# Altium footprint library PcbLib.PcbLib: 142 footprints (part 9 of 9)
Each footprint in its own frame and in the unit in brackets; x right, y up, seen from the top. Pads: shape width x height; smd on the part's side, far side on the other; paste and mask are expansions set on the pad; w line width, h text height; cw(c..) or ccw(c..) is an arc to the next point about the centre after c.
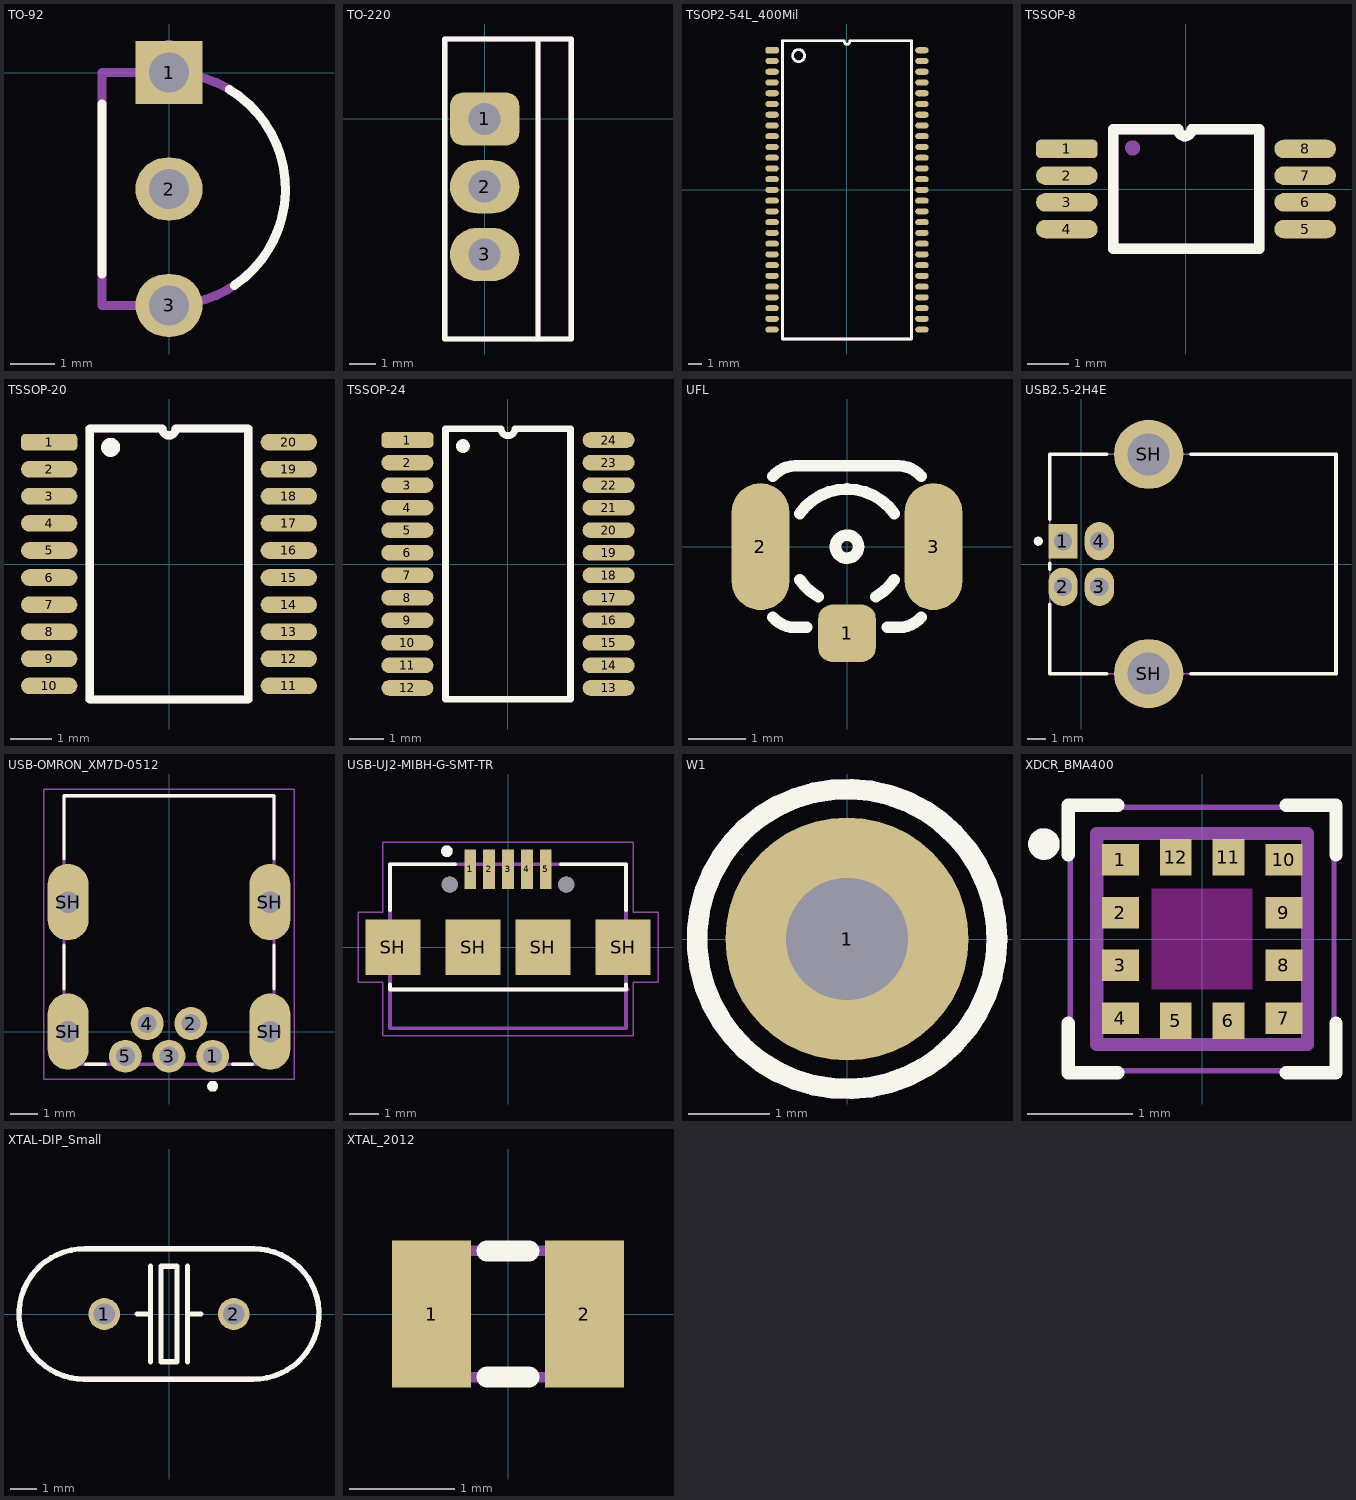
[diagram p8: the footprints below, top view; thin cyan lines are the x and y axes]

## TO-92 [mm]
pads (3):
  rect 1.5x1.4 hole 0.9: 1(0,0)
  oval 1.5x1.4 hole 0.9: 2(0,-2.6) 3(0,-5.2)
Top Overlay:
  lines w0.2: -1.5,-4.5 -1.5,-0.7 ; 1.352,-0.379 cw(c0,-2.6) 1.46,-4.751
Mechanical 29:
  circle w0.254: c0,0.5 r0.1
  lines w0.2: -1.5,-5.2 0,-5.2 ccw(c0,-2.6) 0,0 -1.5,0 -1.5,-5.2
  text ".Designator" at -0.9,-3.067 h1
3D body "TO-92_Cut.STEP": height 10.67, standoff -1.12, extent -1.5,-5.45 2.625,0.3

## TO-220 [mm]
pads (3):
  rrect50% 2.6x2 hole 1.2: 1(0,0)
  oval 2.6x2 hole 1.2: 2(0,-2.54) 3(0,-5.08)
Top Overlay:
  lines w0.2: 2,-8.25 2,3 ; -1.5,-8.25 3.25,-8.25 3.25,3 -1.5,3 -1.5,-8.25
Mechanical 29:
  lines w0.2: 2,-8.25 2,3 ; -1.5,-8.25 -1.5,3 3.25,3 3.25,-8.25 -1.5,-8.25
  text ".Designator" at 0.283,-1.7 h1
3D body "User Library-TO220AB.step": height 20.33, standoff -9, extent -1.495,-8.147 3.195,3.067

## TSOP2-54L_400Mil [mm]
pads (54):
  rrect50% 1x0.45 smd mask+0.05: 1(-5.58,10.4)
  oval 1x0.45 smd mask+0.05: 2(-5.58,9.6) 3(-5.58,8.8) 4(-5.58,8) 5(-5.58,7.2) 6(-5.58,6.4) 7(-5.58,5.6) 8(-5.58,4.8) 9(-5.58,4) 10(-5.58,3.2) 11(-5.58,2.4) 12(-5.58,1.6) 13(-5.58,0.8) 14(-5.58,0) 15(-5.58,-0.8) 16(-5.58,-1.6) 17(-5.58,-2.4) 18(-5.58,-3.2) 19(-5.58,-4) 20(-5.58,-4.8) 21(-5.58,-5.6) 22(-5.58,-6.4) 23(-5.58,-7.2) 24(-5.58,-8) 25(-5.58,-8.8) 26(-5.58,-9.6) 27(-5.58,-10.4) 28(5.58,-10.4) 29(5.58,-9.6) 30(5.58,-8.8) 31(5.58,-8) 32(5.58,-7.2) 33(5.58,-6.4) 34(5.58,-5.6) 35(5.58,-4.8) 36(5.58,-4) 37(5.58,-3.2) 38(5.58,-2.4) 39(5.58,-1.6) 40(5.58,-0.8) 41(5.58,0) 42(5.58,0.8) 43(5.58,1.6) 44(5.58,2.4) 45(5.58,3.2) 46(5.58,4) 47(5.58,4.8) 48(5.58,5.6) 49(5.58,6.4) 50(5.58,7.2) 51(5.58,8) 52(5.58,8.8) 53(5.58,9.6) 54(5.58,10.4)
Top Overlay:
  circle w0.2: c-3.6,10 r0.447
  lines w0.2: -0.203,11.039 ccw(c-0.003,11.039) 0.197,11.039 ; -0.2,11.1 -4.8,11.1 -4.8,-11.1 4.8,-11.1 4.8,11.1 0.2,11.1
Mechanical 29:
  circle w0.2: c-3.6,10 r0.447
  lines w0.2: -0.203,11.039 ccw(c-0.003,11.039) 0.197,11.039 ; -0.2,11.1 -4.8,11.1 -4.8,-11.1 4.8,-11.1 4.8,11.1 0.2,11.1
  text ".Designator" at 0.834,-1.7 h2
3D body "User Library-TSOP2-54.STEP": height 1.3, standoff -0.4, extent -5.879,-11.134 5.881,11.086

## TSSOP-8 [mm]
pads (8):
  rrect50% 1.5x0.45 smd mask+0.05: 1(-2.9,0.975)
  oval 1.5x0.45 smd mask+0.05: 2(-2.9,0.325) 3(-2.9,-0.325) 4(-2.9,-0.975) 5(2.9,-0.975) 6(2.9,-0.325) 7(2.9,0.325) 8(2.9,0.975)
Top Overlay:
  lines w0.254: 1.78,-1.45 1.315,-1.45 -1.775,-1.45 -1.775,1.45 -1.465,1.45 -1.34,1.45 -0.187,1.45 ccw(c-0.025,1.45) 0.138,1.45 1.29,1.45 1.78,1.45 ; 1.785,-1.446 1.785,1.454
Mechanical 29:
  circle w0.254: c-1.3,1 r0.056
  lines w0.254: 1.78,-1.45 1.315,-1.45 -1.775,-1.45 -1.775,1.45 -1.465,1.45 -1.34,1.45 -0.187,1.45 ccw(c-0.025,1.45) 0.138,1.45 1.29,1.45 1.78,1.45 ; 1.785,-1.446 1.785,1.454
  text ".Designator" at -0.846,-0.488 h1
3D body "PW8.step": height 1.2, standoff 0, extent -3.327,-1.549 3.277,1.549

## TSSOP-20 [mm]
pads (20):
  rrect50% 1.35x0.4 smd mask+0.08: 1(-2.875,2.925)
  oval 1.35x0.4 smd mask+0.08: 2(-2.875,2.275) 3(-2.875,1.625) 4(-2.875,0.975) 5(-2.875,0.325) 6(-2.875,-0.325) 7(-2.875,-0.975) 8(-2.875,-1.625) 9(-2.875,-2.275) 10(-2.875,-2.925) 11(2.875,-2.925) 12(2.875,-2.275) 13(2.875,-1.625) 14(2.875,-0.975) 15(2.875,-0.325) 16(2.875,0.325) 17(2.875,0.975) 18(2.875,1.625) 19(2.875,2.275) 20(2.875,2.925)
Top Overlay:
  circle w0.254: c-1.4,2.8 r0.1
  lines w0.2: -1.9,-3.25 1.9,-3.25 1.9,3.25 0.162,3.25 cw(c0,3.25) -0.162,3.25 -1.9,3.25 -1.9,-3.25
Mechanical 29:
  circle w0.254: c-1.4,2.8 r0.1
  lines w0.2: -1.9,-3.25 1.9,-3.25 1.9,3.25 0.162,3.25 cw(c0,3.25) -0.162,3.25 -1.9,3.25 -1.9,-3.25
  text ".Designator" at 0.567,-1.7 h1
3D body "User Library-TSSOP-20-2.STEP": height 1.2, standoff 0, extent -3.2,-3.25 3.2,3.25

## TSSOP-24 [mm]
pads (24):
  rrect50% 1.5x0.45 smd mask+0.08: 1(-2.9,3.575)
  oval 1.5x0.45 smd mask+0.08: 2(-2.9,2.925) 3(-2.9,2.275) 4(-2.9,1.625) 5(-2.9,0.975) 6(-2.9,0.325) 7(-2.9,-0.325) 8(-2.9,-0.975) 9(-2.9,-1.625) 10(-2.9,-2.275) 11(-2.9,-2.925) 12(-2.9,-3.575) 13(2.9,-3.575) 14(2.9,-2.925) 15(2.9,-2.275) 16(2.9,-1.625) 17(2.9,-0.975) 18(2.9,-0.325) 19(2.9,0.325) 20(2.9,0.975) 21(2.9,1.625) 22(2.9,2.275) 23(2.9,2.925) 24(2.9,3.575)
Top Overlay:
  circle w0.2: c-1.3,3.4 r0.1
  lines w0.2: -1.8,-3.9 -1.8,3.9 -0.2,3.9 ccw(c0,3.9) 0.2,3.9 1.8,3.9 1.8,-3.9 -1.8,-3.9
Mechanical 29:
  text ".Designator" at 0.167,-1 h1
3D body "PW0024A.stp": height 1.13, standoff 0, extent -3.2,-3.9 3.2,3.9

## UFL [mm] "CONN RF, COAX UP, U.FL-R-SMT-1 2.8x2.8mm"
pads (3):
  rrect50% 1x1 smd: 1(0,-1.5)
  oval 1x2.2 smd: 2(-1.5,0) 3(1.5,0)
Top Overlay:
  circle w0.2: c0,0 r0.2
  lines w0.2: -1.283,-1.222 ccw(c-0.9,-0.9) -0.9,-1.4 -0.7,-1.4 ; -1.283,1.221 cw(c-0.9,0.9) -0.9,1.4 -0.7,1.4 0.9,1.4 cw(c0.9,0.9) 1.283,1.221 ; -0.819,-0.573 ccw(c0,0) -0.5,-0.866 ; -0.819,0.573 cw(c0,0) 0.819,0.573 ; 0.5,-0.866 ccw(c0,0) 0.819,-0.573 ; 0.7,-1.4 0.9,-1.4 ccw(c0.9,-0.9) 1.283,-1.222
3D body "SW3dPS-U.FL-R-SMT-1.STEP": height 1.25, standoff -0.01, extent -1.5,-1.55 1.5,1.55

## USB2.5-2H4E [mm]
pads (6):
  rect 1.6x1.9 hole 1: 1(-1,1.25)
  oval 1.6x2.1 hole 1: 2(-1,-1.25) 3(1,-1.25) 4(1,1.25)
  round 3.8 hole 2.3: SH(3.71,-6.02) SH(3.71,6.02)
Top Overlay:
  circle w0.25: c-2.35,1.25 r0.125
  lines w0.2: -1.72,-2.21 -1.72,-6.02 1.41,-6.02 ; -1.72,-0.29 -1.72,0.05 ; -1.72,2.45 -1.72,6.02 1.41,6.02 ; 6.01,-6.02 13.99,-6.02 13.99,6.02 6.01,6.02
Mechanical 29:
  lines w0.1: -1.72,-6.02 -1.72,6.02 13.99,6.02 13.99,-6.02 -1.72,-6.02
3D body "14389.STEP": height 10.95, standoff -3.7, extent -2.5,-7.45 14,7.45

## USB-OMRON_XM7D-0512 [mm]
pads (9):
  round 1.208 hole 0.7: 1(1.6,-0.9) 2(0.8,0.3) 3(0,-0.9) 4(-0.8,0.3) 5(-1.6,-0.9)
  oval 1.5x2.8 hole 0.8 square: SH(-3.7,0) SH(-3.7,4.75) SH(3.7,0) SH(3.7,4.75)
Top Overlay:
  circle w0.2: c1.6,-2 r0.1
  lines w0.127: -3.85,1.57 -3.85,3.18 ; -3.85,6.34 -3.85,8.65 3.85,8.65 3.85,6.34 ; -3.06,-1.2 -2.33,-1.2 ; 2.34,-1.2 3.05,-1.2 ; 3.85,1.57 3.85,3.18
Mechanical 29:
  lines w0.127: -3.85,-1.2 -3.85,8.65 3.85,8.65 3.85,-1.2 -3.85,-1.2
  text ".Designator" at -0.8,3.133 h1
Mechanical 15:
  lines w0.05: -4.6,-1.75 4.6,-1.75 4.6,8.9 -4.6,8.9 -4.6,-1.75
3D body "XM7D-0512--3DModel-STEP-1.STEP": height 4.1, standoff -1.8, extent -4.05,-1.1 4.05,8.75

## USB-UJ2-MIBH-G-SMT-TR [mm]
pads (11):
  rect 0.4x1.35 smd mask+0.08: 1(-1.3,2.675) 2(-0.65,2.675) 3(0,2.675) 4(0.65,2.675) 5(1.3,2.675)
  rect 1.9x1.9 smd: SH(-3.95,0) SH(-1.2,0) SH(1.2,0) SH(3.95,0)
  round 0.55 hole 0.55 unplated mask+0.102: ""(-2,2.15) ""(2,2.15)
Top Overlay:
  circle w0.2: c-2.1,3.3 r0.1
  lines w0.127: -4.05,-1.27 -4.05,-1.45 4.05,-1.45 4.05,-1.27 ; -4.05,1.27 -4.05,2.85 -1.82,2.85 ; 1.82,2.85 4.05,2.85 4.05,1.27
Mechanical 13:
  circle w0.2: c-2.1,3.3 r0.1
  lines w0.127: 4.1,-1.45 -4.05,-1.45 ; -4.05,-1.45 -4.05,-2.78 4.05,-2.78 4.05,2.85 -4.05,2.85 -4.05,-1.45
Mechanical 15:
  lines w0.05: -5.15,-1.2 -4.3,-1.2 -4.3,-3.03 4.3,-3.03 4.3,-1.2 5.15,-1.2 5.15,1.2 4.3,1.2 4.3,3.6 -4.3,3.6 -4.3,1.2 -5.15,1.2 -5.15,-1.2
3D body "CUI_DEVICES_UJ2-MIBH-G-SMT-TR.step": height 2.75, standoff -0.5, extent -4.05,-2.763 4.05,2.88

## W1 [mm]
pads (1):
  round 3 hole 1.5: 1(0,0)
Top Overlay:
  circle w0.254: c0,0 r1.849
Mechanical 29:
  circle w0.254: c0,0 r1.849
  text ".Designator" at -0.308,0.025 h1

## XDCR_BMA400 [mm]
pads (12):
  rect 0.35x0.3 smd paste-1 mask+0: 1(-0.775,0.75) 2(-0.775,0.25) 3(-0.775,-0.25) 4(-0.775,-0.75) 7(0.775,-0.75) 8(0.775,-0.25) 9(0.775,0.25) 10(0.775,0.75)
  rect 0.3x0.35 smd paste-1 mask+0: 5(-0.25,-0.775) 6(0.25,-0.775) 11(0.25,0.775) 12(-0.25,0.775)
Top Overlay:
  circle w0.15: c-1.5,0.9 r0.075
  lines w0.127: -1.27,-0.8 -1.27,-1.27 -0.8,-1.27 ; -1.27,0.8 -1.27,1.27 -0.8,1.27 ; 0.8,-1.27 1.27,-1.27 1.27,-0.8 ; 0.8,1.27 1.27,1.27 1.27,0.8
Top Paste:
  region: 0.375,0.625 0.125,0.625 0.125,0.925 0.375,0.925
  region: -0.125,0.625 -0.375,0.625 -0.375,0.925 -0.125,0.925
  region: 0.375,-0.925 0.125,-0.925 0.125,-0.625 0.375,-0.625
  region: -0.125,-0.925 -0.375,-0.925 -0.375,-0.625 -0.125,-0.625
  region: 0.925,-0.875 0.625,-0.875 0.625,-0.625 0.925,-0.625
  region: 0.925,-0.375 0.625,-0.375 0.625,-0.125 0.925,-0.125
  region: 0.925,0.125 0.625,0.125 0.625,0.375 0.925,0.375
  region: 0.925,0.625 0.625,0.625 0.625,0.875 0.925,0.875
  region: -0.625,0.625 -0.925,0.625 -0.925,0.875 -0.625,0.875
  region: -0.625,0.125 -0.925,0.125 -0.925,0.375 -0.625,0.375
  region: -0.625,-0.375 -0.925,-0.375 -0.925,-0.125 -0.625,-0.125
  region: -0.625,-0.875 -0.925,-0.875 -0.925,-0.625 -0.625,-0.625
Top Solder:
  region: 0.45,-1 0.05,-1 0.05,-0.55 0.45,-0.55
  region: -0.05,-1 -0.45,-1 -0.45,-0.55 -0.05,-0.55
  region: 0.45,0.55 0.05,0.55 0.05,1 0.45,1
  region: -0.05,0.55 -0.45,0.55 -0.45,1 -0.05,1
  region: 1,-0.95 0.55,-0.95 0.55,-0.55 1,-0.55
  region: 1,-0.45 0.55,-0.45 0.55,-0.05 1,-0.05
  region: 1,0.05 0.55,0.05 0.55,0.45 1,0.45
  region: 1,0.55 0.55,0.55 0.55,0.95 1,0.95
  region: -0.55,-0.95 -1,-0.95 -1,-0.55 -0.55,-0.55
  region: -0.55,-0.45 -1,-0.45 -1,-0.05 -0.55,-0.05
  region: -0.55,0.05 -1,0.05 -1,0.45 -0.55,0.45
  region: -0.55,0.55 -1,0.55 -1,0.95 -0.55,0.95
Keep-Out Layer:
  region: 0.475,-0.475 -0.475,-0.475 -0.475,0.475 0.475,0.475
  region: 0.475,-0.475 -0.475,-0.475 -0.475,0.475 0.475,0.475
Mechanical 29:
  circle w0.15: c-1.5,0.9 r0.075
  lines w0.127: -1,-1 -1,1 1,1 1,-1 -1,-1
  text ".Designator" at -0.689,-0.61 h1
Mechanical 15:
  lines w0.05: -1.25,-1.25 -1.25,1.25 1.25,1.25 1.25,-1.25 -1.25,-1.25
3D body "BMA400.STEP": height 1, standoff 0, extent -1,-1 1,1

## XTAL-DIP_Small [mm]
pads (2):
  round 1.2 hole 0.8: 1(-2.44,0) 2(2.44,0)
Top Overlay:
  lines w0.2: -1.2,0 -0.7,0 ; -0.7,-1.8 -0.7,1.8 ; 0.7,-1.8 0.7,1.8 ; 0.7,0 1.2,0 ; 3.2,2.46 -3.159,2.46 ccw(c-3.2,0) -3.2,-2.46 3.159,-2.46 ccw(c3.2,0) 3.2,2.46 ; -0.3,-1.8 0.3,-1.8 0.3,1.8 0,1.8 -0.3,1.8 -0.3,-1.8
Mechanical 29:
  lines w0.2: 3.2,2.46 -3.159,2.46 ccw(c-3.2,0) -3.2,-2.46 3.159,-2.46 ccw(c3.2,0) 3.2,2.46
  text ".Designator" at -1.1,-0.367 h1
3D body "ABRACON_ABL-8.000MHZ-B2.STEP": height 3.55, standoff -2.02, extent -5.75,-2.5 5.75,2.5

## XTAL_2012 [mm]
pads (2):
  rect 0.75x1.4 smd: 1(-0.725,0) 2(0.725,0)
Top Overlay:
  lines w0.2: -0.2,-0.6 0.2,-0.6 ; -0.2,0.6 0.2,0.6
Mechanical 29:
  lines w0.1: -1,-0.5 cw(c-1,-0.6) -0.9,-0.6 0.9,-0.6 cw(c1,-0.6) 1,-0.5 1,0.5 cw(c1,0.6) 0.9,0.6 -0.9,0.6 cw(c-1,0.6) -1,0.5 -1,-0.5
  text ".Designator" at -0.3,-0.1 h0.3
3D body "User Library-ABS06.STEP": height 0.6, standoff 0, extent -1,-0.61 1,0.61